# Altium footprint library Toi Library.PcbLib: 740 footprints (part 40 of 47)
Each footprint in its own frame and in the unit in brackets; x right, y up, seen from the top. Pads: shape width x height; smd on the part's side, far side on the other; paste and mask are expansions set on the pad; w line width, h text height; cw(c..) or ccw(c..) is an arc to the next point about the centre after c.
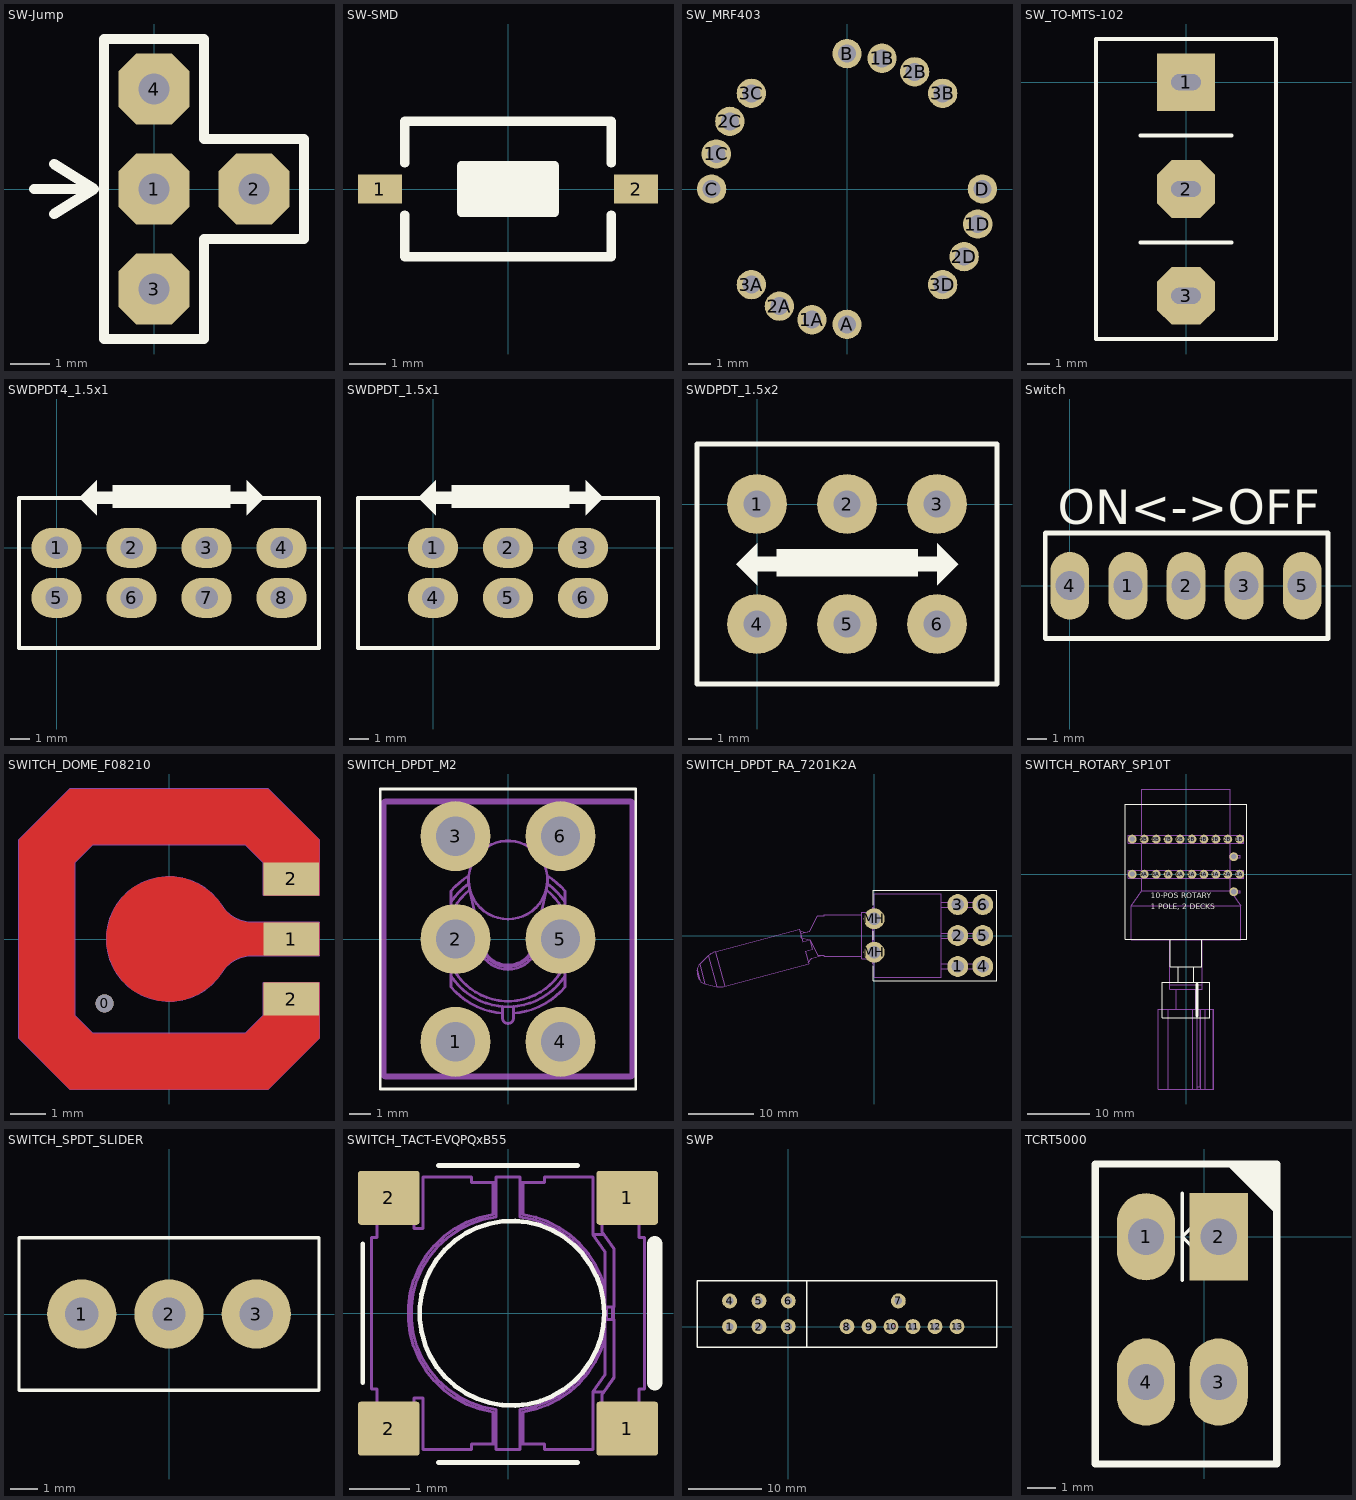
[diagram p39: the footprints below, top view; thin cyan lines are the x and y axes]

## SW-Jump [mm]
pads (4):
  oct 1.8x1.8 hole 0.8: 1(0,0) 2(2.54,0) 3(0,-2.54) 4(0,2.54)
Top Overlay:
  lines w0.254: -3.048,0 -1.524,0 ; -2.54,-0.635 -1.524,0 ; -2.54,0.635 -1.524,0 ; -1.27,-3.81 1.27,-3.81 1.27,-1.27 3.81,-1.27 3.81,1.27 1.27,1.27 1.27,3.81 -1.27,3.81 -1.27,-1.27 -1.27,1.27 -1.27,-3.81

## SW-SMD [mm] "Switch SMD type"
pads (2):
  rect 1.2x0.8 smd: 1(-3.5,0) 2(3.5,0)
Top Overlay:
  rectangle: -1.27,-0.635 1.27,0.635
  lines w0.254: -2.819,-0.711 -2.819,-1.854 2.819,-1.854 2.819,-0.711 ; -2.819,0.711 -2.819,1.854 2.819,1.854 2.819,0.711 ; -1.27,-0.635 -1.27,0.635 1.27,0.635 1.27,-0.635 -1.27,-0.635
3D body "User Library-Button-SMD.step": height 2.5, standoff 0, extent -3.05,-1.85 3.05,1.85

## SW_MRF403 [mm]
height 8.2
pads (16):
  round 1.3 hole 0.8: 1A(-1.553,-5.796) 1B(1.553,5.796) 1C(-5.796,1.553) 1D(5.796,-1.553) 2A(-3,-5.196) 2B(3,5.196) 2C(-5.196,3) 2D(5.196,-3) 3A(-4.243,-4.243) 3B(4.243,4.243) 3C(-4.243,4.243) 3D(4.243,-4.243) A(0,-6) B(0,6) C(-6,0) D(6,0)
3D body "MRF403.STEP": height 8.2, standoff -3.51, extent -9.896,-9.896 9.896,9.896

## SW_TO-MTS-102 [mm]
pads (3):
  rect 2.54x2.54 hole 0.7 slot 1.3 at 0 deg: 1(0,0)
  oct 2.54x2.54 hole 0.7 slot 1.3 at 0 deg: 2(0,-4.7) 3(0,-9.4)
Top Overlay:
  lines w0.178: -2,-7.05 2,-7.05 ; -2,-2.35 2,-2.35 ; -3.95,-11.3 3.95,-11.3 3.95,1.9 -3.95,1.9 -3.95,-11.3
3D body "User Library-7101SYZBE CK switch.STEP": height 28.46, standoff -3.92, extent -3.43,-11.062 3.43,1.662

## SWDPDT4_1.5x1 [mil] "Switch 3 DPDT, Pin to Pin 150mil, Row to Row 100mil"
pads (8):
  oval 100x80 hole 45: 1(0,0) 2(150,0) 3(300,0) 4(450,0) 5(0,-100) 6(150,-100) 7(300,-100) 8(450,-100)
Top Overlay:
  region: 112.5,125 347.5,125 347.5,80 112.5,80
  region: 380,135 380,65 415,100
  region: 80,135 80,65 45,100
  lines w8: -75,-200 -75,100 525,100 525,-200 -75,-200
  lines w25: 75,100 125,100 ; 335,100 385,100

## SWDPDT_1.5x1 [mil] "Switch DPDT, Pin to Pin 150mil, Row to Row 100mil"
pads (6):
  oval 100x80 hole 45: 1(0,0) 2(150,0) 3(300,0) 4(0,-100) 5(150,-100) 6(300,-100)
Top Overlay:
  region: 5,135 5,65 -30,100
  region: 305,135 305,65 340,100
  region: 37.5,125 272.5,125 272.5,80 37.5,80
  lines w8: -150,-200 450,-200 450,100 -150,100 -150,-200
  lines w25: 0,100 50,100 ; 260,100 310,100

## SWDPDT_1.5x2 [mil] "Switch DPDT, Pin to Pin 150mil, Row to Row 200mil"
pads (6):
  round 100 hole 45: 1(0,0) 2(150,0) 3(300,0) 4(0,-200) 5(150,-200) 6(300,-200)
Top Overlay:
  region: 0,-65 0,-135 -35,-100
  region: 300,-65 300,-135 335,-100
  region: 32.5,-75 267.5,-75 267.5,-120 32.5,-120
  lines w8: -100,-300 400,-300 400,100 -100,100 -100,-300
  lines w25: -5,-100 45,-100 ; 255,-100 305,-100

## Switch [mm]
pads (5):
  oval 2x3.5 hole 1.5: 1(3,0) 2(6,0) 3(9,0) 4(0,0) 5(12,0)
Top Overlay:
  lines w0.254: -1.27,-2.73 13.335,-2.73 13.335,2.73 -1.27,2.73 -1.27,-2.73
  text "ON<->OFF" at -0.635,3.175 h1.8
3D body "User Library-Assem1-20.STEP": height 2.6, standoff -6, extent -0.5,-2.85 12.5,9.35

## SWITCH_DOME_F08210 [mm] "Snaptron F08210 dome switch"
height 0.5
pads (4):
  round 0.508 hole 0.508 unplated: 0(-1.8,-1.8)
  rect 1.55x0.92 smd paste-0.8: 1(3.415,0) 2(3.415,-1.68) 2(3.415,1.68)
Top Layer:
  region: 1.472,-0.927 1.372,-1.086 1.109,-1.354 0.795,-1.559 0.444,-1.693 0.073,-1.749 -0.302,-1.724 -0.663,-1.62 -0.993,-1.441 -1.278,-1.196 -1.503,-0.896 -1.66,-0.555 -1.74,-0.188 -1.74,0.188 -1.66,0.555 -1.503,0.896 -1.278,1.196 -0.993,1.441 -0.663,1.62 -0.302,1.724 0.073,1.749 0.444,1.693 0.795,1.559 1.109,1.354 1.372,1.086 1.472,0.927 1.546,0.825 1.729,0.652 1.949,0.531 2.193,0.468 2.319,0.46 4.19,0.46 4.19,-0.46 2.319,-0.46 2.193,-0.468 1.949,-0.531 1.729,-0.652 1.546,-0.825
  region: -2.77,-4.19 -4.19,-2.77 -4.19,2.77 -2.77,4.19 2.77,4.19 4.19,2.77 4.19,1.22 2.64,1.22 2.64,2.128 2.128,2.64 -2.128,2.64 -2.64,2.128 -2.64,-2.128 -2.128,-2.64 2.128,-2.64 2.64,-2.128 2.64,-1.22 4.19,-1.22 4.19,-2.77 2.77,-4.19
Mechanical 3:
  lines w0.05: -4.19,-2.77 -2.77,-4.19 2.77,-4.19 4.19,-2.77 4.19,-1.22 2.64,-1.22 2.64,-2.128 2.128,-2.64 -2.128,-2.64 -2.64,-2.128 -2.64,2.128 -2.128,2.64 2.128,2.64 2.64,2.128 2.64,1.22 4.19,1.22 4.19,2.77 2.77,4.19 -2.77,4.19 -4.19,2.77 -4.19,-2.77 ; 1.472,-0.927 cw(c2.319,-1.46) 2.319,-0.46 4.19,-0.46 4.19,0.46 2.319,0.46 cw(c2.319,1.46) 1.472,0.927 ccw(c0,0) 1.472,-0.927
3D body: height 0.48, standoff 0, extent -3.546,-3.546 3.546,3.546

## SWITCH_DPDT_M2 [mm] "NKK M2 Series DPDT Switch with 03 pin option"
height 28.448
pads (6):
  round 3.2 hole 1.8: 1(-2.4,-4.7) 2(-2.4,0) 3(-2.4,4.7) 4(2.4,-4.7) 5(2.4,0) 6(2.4,4.7)
Top Overlay:
  lines w0.127: -5.842,-6.858 5.842,-6.858 5.842,6.858 -5.842,6.858 -5.842,-6.858
Mechanical 13:
  lines w0.127: -5.716,-6.313 -5.626,-6.223 ; -5.716,6.313 -5.626,6.223 ; -2.604,-1.681 ccw(c0,0) 2.604,-1.681 ; -2.604,-1.147 ccw(c0,0) 2.604,-1.147 ; -2.604,1.147 cw(c0,0) -1.752,2.241 ; -2.604,1.681 cw(c0,0) -1.801,2.522 ; -1.795,2.892 ccw(c0,0) -2.604,2.192 -2.604,-2.192 ccw(c0,0) -0.254,-3.394 ; -1.766,2.302 -1.191,-0.254 ccw(c0,0.033) 1.191,-0.254 1.766,2.302 ; -1.338,0.401 ccw(c0,0) 1.338,0.401 ; -1.267,0.085 ccw(c0,0) 1.267,0.085 ; -0.254,-3.088 -0.254,-3.607 ccw(c0,-3.607) 0.254,-3.607 0.254,-3.088 ; 0.254,-3.394 ccw(c0,0) 2.604,-2.192 2.604,2.192 ccw(c0,0) 1.795,2.892 ; 1.752,2.241 cw(c0,0) 2.604,1.147 ; 1.801,2.522 cw(c0,0) 2.604,1.681 ; 5.716,-6.313 5.626,-6.223 ; 5.716,6.313 5.626,6.223 ; -5.626,-6.223 -5.626,6.223 ; -5.626,-6.223 5.626,-6.223 ; -5.626,6.223 5.626,6.223 ; 5.626,-6.223 5.626,6.223 ; -5.753,-6.223 ccw(c-5.626,-6.223) -5.626,-6.35 5.626,-6.35 ccw(c5.626,-6.223) 5.753,-6.223 5.753,6.223 ccw(c5.626,6.223) 5.626,6.35 -5.626,6.35 ccw(c-5.626,6.223) -5.753,6.223 -5.753,-6.223 ; -1.808,2.679 ccw(c0,2.715) 1.808,2.679 ccw(c0,2.679) -1.808,2.679
3D body "Toggle Switch M2T2SG03.STEP": height 29.15, standoff -4.8, extent -5.753,-6.35 5.753,6.35

## SWITCH_DPDT_RA_7201K2A [mil] "DPDT Switch Right-angle PCB mount - C&K 7201K2A"
height 450
pads (8):
  round 125 hole 73: 1(500,-185) 2(500,0) 3(500,185) 4(650,-185) 5(650,0) 6(650,185) MH(0,-100) MH(0,100)
Top Overlay:
  lines w5: -5,-180 -5,-270 735,-270 735,270 -5,270 -5,180 ; -5,-25 -5,25
Mechanical 13:
  lines w1.97: -445.94,27.92 -415.18,18.2 -384.21,26.59 ; -395.27,-159.34 -373.61,-135.45 -309.44,-118.08 ; -75,-125 -298.04,-125 -298.04,-118.08 -338.46,-118.08 -385,-25 ; -75,125 -298.04,125 -298.04,118.08 -338.46,118.08 -385,25 -435,12.5 -435,-12.5 -385,-25 ; -10,-145 0,-145 ; -10,-140 -75,-140 -75,140 -10,140 ; -10,145 0,145 ; 0,-170 -10,-170 -10,170 0,170 ; 400,-200 675,-200 675,-170 400,-170 ; 400,-15 675,-15 675,15 400,15 ; 400,170 675,170 675,200 400,200 ; 610,-200 610,-170 ; 610,-15 610,15 ; 610,170 610,200 ; -1060.2,-211.44 ccw(c-960.2,-211.71) -1046.43,-262.36 ; -1060.2,-211.44 -1060.19,-208.22 ; -1060.2,-211.44 -1046.43,-262.36 ; -1060.19,-208.22 cw(c-1010.19,-208.35) -1044.77,-172.23 ; -1060.19,-208.22 -1044.79,-265.13 ; -1046.43,-262.36 -1044.79,-265.13 ; -1044.79,-265.13 ccw(c-1001.68,-239.81) -1013.33,-288.43 ; -1044.77,-172.24 -992.57,-122.27 ; -1044.77,-172.24 -1013.33,-288.43 ; -1013.33,-288.43 -943.06,-305.26 ; -992.57,-122.27 cw(c-923.42,-194.5) -949.54,-97.97 ; -992.57,-122.27 -943.06,-305.26 ; -949.54,-97.97 -448.55,37.57 -428.44,-36.75 -385,-25 ; -949.54,-97.97 -893.64,-304.55 ; -943.06,-305.26 ccw(c-919.76,-208.02) -893.64,-304.55 ; -893.64,-304.55 -392.66,-169 -412.77,-94.67 -369.33,-82.92 -385,-25 ; 0,-250 400,-250 400,250 0,250 0,-250
3D body: height 450, standoff -125, extent -1060.14,-308 675,250.01

## SWITCH_ROTARY_SP10T [mil] "Grayhill 71AF style 2-deck single pole 10-position rotary switch"
height 712.6
pads (22):
  round 56 hole 32: 1A(337.5,0) 1B(337.5,220) 2A(262.5,0) 2B(262.5,220) 3A(187.5,0) 3B(187.5,220) 4A(112.5,0) 4B(112.5,220) 5A(37.5,0) 5B(37.5,220) 6A(-37.5,0) 6B(-37.5,220) 7A(-112.5,0) 7B(-112.5,220) 8A(-187.5,0) 8B(-187.5,220) 9A(-262.5,0) 9B(-262.5,220) 10A(-337.5,0) 10B(-337.5,220) C1A(300,-110) C1B(300,110)
Top Overlay:
  lines w5: -100,-410 -100,-580 100,-580 100,-410 ; -50,-580 -50,-680 50,-680 50,-580 ; -380,-410 -380,440 380,440 380,-410 -380,-410 ; -150,-900 -150,-680 150,-680 150,-900 -150,-900
  lines w20: 70,-890 70,-690
  text "1 POLE, 2 DECKS" at -220,-220 h35
  text "10-POS ROTARY" at -220,-150 h35
Mechanical 13:
  lines w5: -343.5,-25 -343.5,25 ; -343.5,195 -343.5,245 ; -278.5,-25 -278.5,-104.17 ; -278.5,25 -278.5,195 ; -278.5,245 -278.5,535 278.5,535 278.5,245 ; -112.06,-1349 -112.06,-849 ; -101.5,-694 101.5,-694 ; -101.5,-412 -101.5,-724 101.5,-724 101.5,-412 ; -62.5,-849 -62.5,-724 ; 43.85,-1349 43.85,-849 ; 62.5,-849 62.5,-724 ; 70,-1349 70,-849 ; 70,-1334 89.14,-1334 89.14,-849 ; 93.78,-1349 93.78,-849 ; 119.93,-1349 119.93,-849 ; 169.67,-1349 169.67,-849 ; 278.5,-102.5 278.5,-25 ; 278.5,25 278.5,102.5 ; 278.5,117.5 278.5,195 ; 287.83,-117.5 343.5,-197 ; 343.5,-25 343.5,25 ; 343.5,195 343.5,245 ; -343.5,-197 -343.5,-412 343.5,-412 343.5,-197 ; -343.5,-197 -278.5,-104.17 ; -343.5,-197 343.5,-197 ; -278.5,-104.17 275.61,-104.17 ; 275.61,-104.17 285.04,-117.5 340,-117.5 340,-102.5 275.61,-102.5 275.61,-104.17 ; -362.5,-25 362.5,-25 362.5,25 -362.5,25 -362.5,-25 ; -362.5,195 362.5,195 362.5,245 -362.5,245 -362.5,195 ; -175,-1349 -175,-849 175,-849 175,-1349 -175,-1349 ; 275.61,102.5 275.61,117.5 340,117.5 340,102.5 275.61,102.5
3D body: height 711.5, standoff -156, extent -362.49,-1348.99 362.51,535

## SWITCH_SPDT_SLIDER [mil] "TE Connectivity SLS121PC04 SPDT slider"
height 396
pads (3):
  round 100 hole 48: 1(-126,0) 2(0,0) 3(126,0)
Top Overlay:
  lines w5: -216.54,-110.24 -216.54,110.24 216.54,110.24 216.54,-110.24 -216.54,-110.24
3D body: height 394, standoff -170, extent -216.49,-109.99 216.51,110.01

## SWITCH_TACT-EVQPQxB55 [mil] "Panasonic SMD tact switch 4.5x4.5x0.55mm, EVQPQxB55"
height 21.65
pads (4):
  rrect10% 40x35 smd: 1(77.5,-75) 1(77.5,75) 2(-77.5,-75) 2(-77.5,75)
Top Overlay:
  circle w3: c2.5,0 r60
  lines w3: -94.5,-45.28 -94.5,45.28 ; -45.28,-97 45.28,-97 ; -45.28,96 45.28,96
  lines w10: 95.5,-45.28 95.5,45.28
Mechanical 13:
  lines w1.97: -85.04,-84.12 -61.02,-84.12 ; -85.04,-79.15 -61.02,-79.15 ; -85.04,-77.22 -61.02,-77.22 ; -85.04,-68.45 -61.02,-68.45 ; -85.04,-66.52 -61.02,-66.52 ; -85.04,-62.25 -61.02,-62.25 ; -85.04,-58.68 -61.02,-58.68 ; -85.04,58.68 -61.02,58.68 ; -85.04,62.25 -61.02,62.25 ; -85.04,66.52 -61.02,66.52 ; -85.04,68.45 -61.02,68.45 ; -85.04,77.22 -61.02,77.22 ; -85.04,79.15 -61.02,79.15 ; -85.04,84.12 -61.02,84.12 ; -9.84,-85.04 -9.84,-64.21 cw(c0,0) -9.84,64.21 -9.84,85.04 ; -7.87,-85.04 -23.62,-85.04 -23.62,-88.58 -55.12,-88.58 -55.12,-55.12 -61.02,-55.12 -61.02,-86.61 -85.04,-86.61 -85.04,-49.21 -88.58,-49.21 -88.58,49.21 -85.04,49.21 -85.04,86.61 -61.02,86.61 -61.02,55.12 -55.12,55.12 -55.12,88.58 -23.62,88.58 -23.62,85.04 -7.87,85.04 ; -7.87,-62.5 -7.87,-88.58 7.87,-88.58 7.87,-62.5 ; -7.87,62.5 -7.87,88.58 7.87,88.58 7.87,62.5 ; -7.81,-62.51 cw(c0,0) -7.81,62.51 ; 7.81,-62.51 ccw(c0,0) 7.81,62.51 ; 7.87,-85.04 23.62,-85.04 23.62,-88.58 55.12,-88.58 55.12,-51.29 62.99,-40.04 62.99,40.04 55.12,51.29 55.12,88.58 23.62,88.58 23.62,85.04 7.87,85.04 ; 9.84,-85.04 9.84,-64.21 ccw(c0,0) 62.99,-15.87 ; 9.84,85.04 9.84,64.21 cw(c0,0) 62.99,15.87 ; 55.19,-51.18 62.4,-51.18 ; 55.19,51.18 62.4,51.18 ; 61.02,-84.12 85.04,-84.12 ; 61.02,-79.15 85.04,-79.15 ; 61.02,-77.22 85.04,-77.22 ; 61.02,-68.45 85.04,-68.45 ; 61.02,-66.52 85.04,-66.52 ; 61.02,-62.25 85.04,-62.25 ; 61.02,-58.68 85.04,-58.68 ; 61.02,58.68 85.04,58.68 ; 61.02,62.25 85.04,62.25 ; 61.02,66.52 85.04,66.52 ; 61.02,68.45 85.04,68.45 ; 61.02,77.22 85.04,77.22 ; 61.02,79.15 85.04,79.15 ; 61.02,84.12 85.04,84.12 ; 64.09,-3.94 64.09,3.94 ; 67.8,-3.94 67.8,3.94 ; 68.44,-3.94 68.44,3.94 ; 61.02,-86.61 85.04,-86.61 85.04,-49.21 88.58,-49.21 88.58,49.21 85.04,49.21 85.04,86.61 61.02,86.61 61.02,53.15 68.9,41.9 68.9,3.94 63.45,3.94 63.45,-3.94 68.9,-3.94 68.9,-41.9 61.02,-53.15 61.02,-86.61
3D body: height 21.65, standoff 0, extent -88.57,-88.58 88.59,88.59

## SWP [mil] "SW Power"
height 100
pads (13):
  round 80 hole 40: 1(-314.96,0) 2(-157.48,0) 3(0,0) 4(-314.96,137.8) 5(-157.48,137.8) 6(0,137.8) 7(590.55,137.8) 8(314.96,0) 9(433.07,0) 10(551.18,0) 11(669.29,0) 12(787.4,0) 13(905.51,0)
Top Overlay:
  lines w8: 100,-109.33 100,245 ; -490,-110 1120,-110 1120,245 -490,245 -490,-110

## TCRT5000 [mil] "Opto hinh chu U"
height 104.33
pads (4):
  oval 80x120 hole 50: 1(-80,0) 3(20,-200) 4(-80,-200)
  rect 80x120 hole 50: 2(20,0)
Top Overlay:
  region: 97.5,97.5 32.5,97.5 97.5,32.5
  lines w5: -30,-60 -30,60 ; 20,-50 -30,0 20,50 ; 20,-50 20,50 ; 20,-50 20,50
  lines w10: -150,-312.76 -150,100 100,100 100,-312.76 -150,-312.76
3D body "User Library-TCRT-5000.STEP": height 255.91, standoff -1000.44, extent -138.35,-312.76 90,92.76